# Altium footprint library GyokuRe.PcbLib: 1248 footprints (part 52 of 78)
Each footprint in its own frame and in the unit in brackets; x right, y up, seen from the top. Pads: shape width x height; smd on the part's side, far side on the other; paste and mask are expansions set on the pad; w line width, h text height; cw(c..) or ccw(c..) is an arc to the next point about the centre after c.
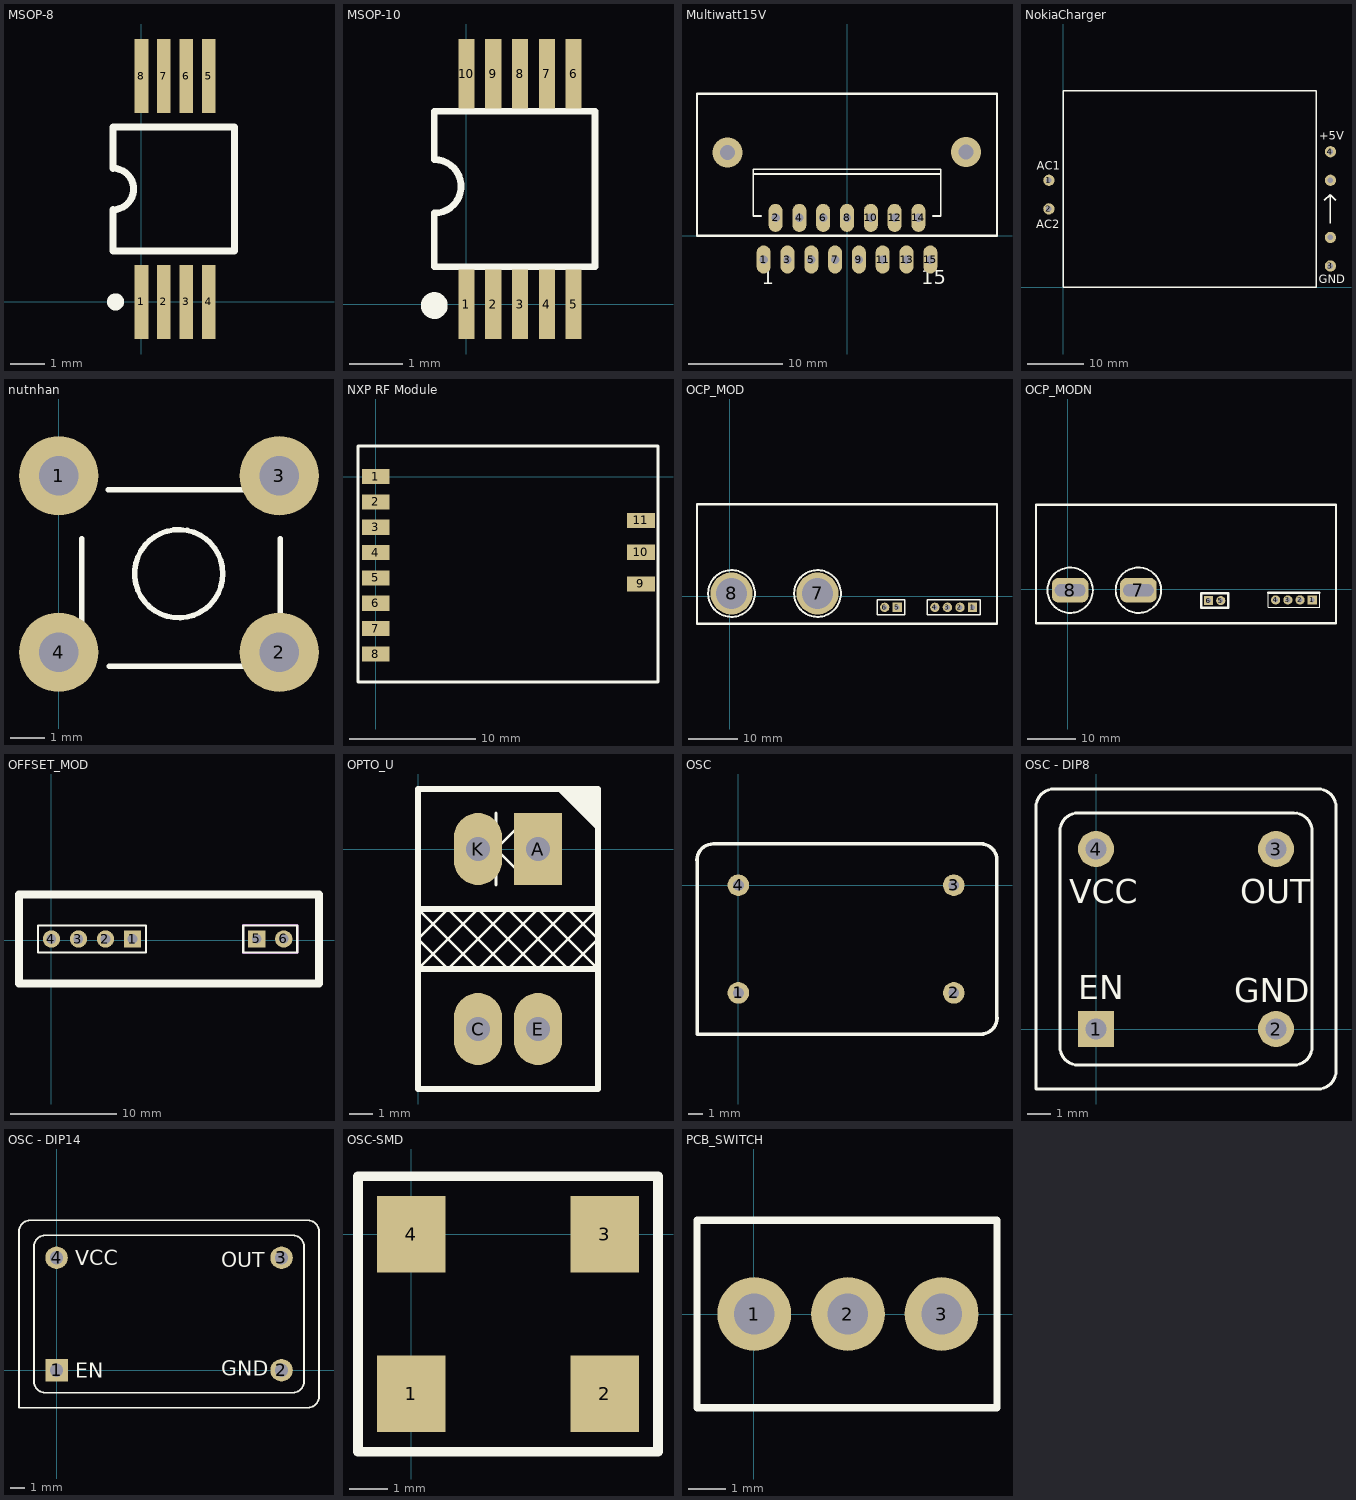
[diagram p51: the footprints below, top view; thin cyan lines are the x and y axes]

## MSOP-8 [mm] "MSOP, Plastic; 8 Leads; Body 3x3 mm; Pitch 0.65 mm"
height 1.99
pads (8):
  rect 0.4x2.15 smd: 1(0,0) 2(0.65,0) 3(1.3,0) 4(1.95,0) 5(1.95,6.55) 6(1.3,6.55) 7(0.65,6.55) 8(0,6.55)
Top Overlay:
  circle w0.25: c-0.75,0 r0.125
  lines w0.2: 2.7,1.475 -0.825,1.475 -0.825,2.675 ccw(c-0.825,3.275) -0.825,3.875 -0.825,5.075 2.7,5.075 2.7,1.5

## MSOP-10 [mm] "MSOP, Plastic; 10 Leads; Body 3x3 mm; Pitch 0.5 mm"
pads (10):
  rect 0.3x1.3 smd: 1(0,0) 2(0.5,0) 3(1,0) 4(1.5,0) 5(2,0) 6(2,4.3) 7(1.5,4.3) 8(1,4.3) 9(0.5,4.3) 10(0,4.3)
Top Overlay:
  circle w0.25: c-0.6,-0.025 r0.125
  lines w0.127: -0.6,0.7 -0.6,1.7 ccw(c-0.6,2.2) -0.6,2.7 -0.6,3.6 2.4,3.6 2.4,0.7 -0.6,0.7

## Multiwatt15V [mm] "TO, Thru-Hole, Vertical, Heatsink Mounted; 15 Bent Staggered Leads; Pitch 1.27 mm"
height 21
pads (15):
  oval 1.5x3 hole 0.9: 1(-8.89,-2.54) 2(-7.62,1.905) 3(-6.35,-2.54) 4(-5.08,1.905) 5(-3.81,-2.54) 6(-2.54,1.905) 7(-1.27,-2.54) 8(0,1.905) 9(1.27,-2.54) 10(2.54,1.905) 11(3.81,-2.54) 12(5.08,1.905) 13(6.35,-2.54) 14(7.62,1.905) 15(8.89,-2.54)
via 12.687,8.928 diameter 3.2 hole 1.6
via -12.763,8.903 diameter 3.2 hole 1.6
Top Overlay:
  lines w0.2: -10,6.59 10,6.59 ; -9.144,2.09 -10,2.09 -10,7.09 10,7.09 10,2.09 9.144,2.09
  lines w0.254: -16,0 16,0 16,15.136 -16,15.136 -16,0
  text "1" at -9.12,-5.165 h1.5
  text "15" at 7.94,-5.165 h1.5
3D body "User Library-MULTIWAT T15.step": height 22.74, standoff -2.18, extent -9.8,-2.815 9.8,6.253

## NokiaCharger [mm]
pads (6):
  round 2 hole 1: 1(-2.54,19.05) 2(-2.54,13.97) 3(47.54,3.81) 4(47.54,24.13) TEMP(47.54,8.89) TEMP(47.54,19.05)
Top Overlay:
  lines w0.254: 46.482,15.494 47.498,16.51 ; 47.498,11.43 47.498,16.51 ; 48.514,15.494 47.498,16.51 ; 0,0 0,35 ; 0,0 45,0 ; 0,0 45,0 ; 0,35 45,35 ; 0,35 45,35 ; 45,0 45,35
  text "GND" at 45.466,0.762 h1.52
  text "+5V" at 45.593,26.289 h1.52
  text "AC1" at -4.699,20.955 h1.52
  text "AC2" at -4.826,10.541 h1.52

## nutnhan [mil]
pads (4):
  round 90 hole 45: 1(0,-100) 2(250,-300) 3(250,-100) 4(0,-300)
Top Overlay:
  circle w6: c136,-211 r50
  lines w6: 26,-266 26,-171 ; 56,-116 211,-116 ; 57,-316 211,-316 ; 251,-266 251,-171
  lines w7: 250,-331 251,-330
3D body "SW3dPS-.STEP": height 275.59, standoff -137.8, extent -25.51,-322.04 285.51,-77.95

## NXP RF Module [mm] "NXP Wireless Module"
pads (11):
  rect 2.2x1.2 smd: 1(0,0) 2(0,-2.007) 3(0,-4.013) 4(0,-6.02) 5(0,-8.026) 6(0,-10.033) 7(0,-12.04) 8(0,-14.046) 9(21,-8.5) 10(21,-5.986) 11(21,-3.472)
Top Overlay:
  lines w0.254: -1.397,-16.256 -1.397,2.413 22.352,2.413 22.352,-16.256 -1.397,-16.256

## OCP_MOD [mil]
pads (8):
  rect 75x75 hole 40: 1(1935,-90) 5(1335,-90)
  round 75 hole 40: 2(1835,-90) 3(1735,-90) 4(1635,-90) 6(1235,-90)
  round 334.65 hole 244.09: 7(700,20) 8(15,20)
Top Overlay:
  circle w16: c15,20 r186
  circle w16: c700,20 r186
  lines w10: 1175,-150 1395,-150 1395,-30 1175,-30 1175,-150 ; 1575,-150 1575,-30 1995,-30 1995,-150 1575,-150
  lines w19.68: -260,730 -260,-220 2130,-220 2130,730 -250,730
3D body "Samtec-TSW-104-07-G-S.step": height 330, standoff -100, extent 1585,-140 1985,-40
3D body "Samtec-TSW-102-07-G-S.step": height 330, standoff -100, extent 1185,-140 1385,-40

## OCP_MODN [mil]
pads (8):
  rect 75x75 hole 40: 1(2005,-90) 6(1155,-95)
  round 75 hole 40: 2(1905,-90) 3(1805,-90) 4(1705,-90) 5(1255,-95)
  rrect50% 300x200 hole 100 slot 250 at 0 deg: 7(580,-10) 8(20,-10)
Top Overlay:
  circle w16: c20,-10 r186
  circle w16: c580,-10 r186
  lines w10: 1095,-35 1095,-155 1315,-155 ; 1645,-30 1645,-150 2065,-150 2065,-30
  lines w19.68: 1095,-40 1095,-155 1315,-155 1315,-35 1095,-35 ; 1645,-30 2065,-30 ; -260,-280 2200,-280 2200,690 -260,690 -260,-280
3D body "Samtec-TSW-104-07-G-S.step": height 330, standoff -100, extent 1655,-140 2055,-40
3D body "Samtec-TSW-102-07-G-S.step": height 330, standoff -100, extent 1105,-145 1305,-45

## OFFSET_MOD [mil]
pads (6):
  rect 64x64 hole 35.43: 1(300,5) 5(759.56,5.28)
  round 64 hole 35.43: 2(200,5) 3(100,5) 4(0,5) 6(859.56,5.28)
Top Overlay:
  lines w7.87: 708.56,54.28 908.56,54.28 ; 709.56,55.28 709.56,-44.72 909.56,-44.72 909.56,55.28 ; -50,-45 -50,55 350,55 350,-45 -50,-45
  lines w30: -120,-160 -120,170 990,170 990,0 990,-160 -120,-160
Bottom Overlay:
  lines w7.87: -50,-45 350,-45 350,55 -50,55 -50,-45 ; 709.56,-44.72 709.56,55.28 909.56,55.28 909.56,-44.72 709.56,-44.72
Mechanical 13:
  lines w7.87: 708.82,-46.18 708.82,56.18 909.61,56.18 909.61,-46.18 708.82,-46.18
3D body: height 100, standoff 10, extent 709,-45 909,55
3D body: height 350, standoff -100, extent 749.56,-4.72 769.56,15.28
3D body: height 350, standoff -100, extent 849.56,-4.72 869.56,15.28
3D body: height 350, standoff -100, extent -10,-5 10,15
3D body: height 350, standoff -100, extent 90,-5 110,15
3D body: height 350, standoff -100, extent 190,-5 210,15
3D body: height 350, standoff -100, extent 290,-5 310,15
3D body: height 100, standoff 10, extent 150,-45 350,55
3D body: height 100, standoff 10, extent 50,-45 250,55
3D body: height 100, standoff 10, extent -50,-45 150,55

## OPTO_U [mil] "Opto hinh chu U"
height 104.33
pads (4):
  rect 80x120 hole 40: A(200,0)
  oval 80x120 hole 40: C(100,-300) E(200,-300) K(100,0)
Top Overlay:
  region: 297.5,97.5 232.5,97.5 297.5,32.5
  lines w5: 0,-200 50,-150 100,-100 200,-200 230,-170 300,-100 300,-200 200,-100 100,-200 90,-190 60,-160 0,-100 ; 130,-60 130,60 ; 180,-50 130,0 180,50 ; 180,-50 180,50 ; 180,-50 180,50 ; 0,-150 50,-100 150,-200 250,-100 300,-150 250,-200 150,-100 50,-200 30,-180 0,-150
  lines w10: 0,-200 300,-200 ; 0,-150 0,-110 ; 0,-100 300,-100 ; 300,-150 300,-140 ; 0,-400 0,100 300,100 300,-400 0,-400
3D body "SW3dPS-optek opb620.STEP": height 374.02, standoff -100, extent 43.46,-346.85 260,46.85

## OSC [mil] "Sealed Oscillator; Through-Hole; 4 Leads"
pads (4):
  round 60 hole 30: 1(0,-300) 2(600,-300) 3(600,0) 4(0,0)
Top Overlay:
  lines w10: -115.21,69.79 cw(c-70,69.79) -70,115 675,115 ; -115,70 -115,-415 675,-415 ccw(c675,-369.79) 720.21,-369.79 ; 674.79,115.21 cw(c674.79,70) 720,70 720,-370
3D body "User Library-ocs-1.step": height 215.03, standoff -225.91, extent -98.62,-398.02 698.63,98.04

## OSC - DIP8 [mil]
pads (4):
  rect 60x60 hole 35.43: 1(0,0)
  round 60 hole 35.43: 2(300,0) 3(300,300) 4(0,300)
Top Overlay:
  lines w5: 359.1,337.28 ccw(c330,330) 330,360 -30,360 ccw(c-30,330) -60,330 -60,-30 ccw(c-30,-30) -30,-60 330,-60 ccw(c330,-30) 360,-30 ; 360,-35 360,335 ; 400,370 ccw(c370,370) 370,400 -70,400 ccw(c-70,370) -100,370 -100,-100 370,-100 ccw(c370,-70) 400,-70 400,375
  text "EN" at -30,50 h40
  text "GND" at 230,45 h40
  text "OUT" at 240,210 h40
  text "VCC" at -45,210 h40

## OSC - DIP14 [mil]
pads (4):
  rect 60x60 hole 35.43: 1(0,0)
  round 60 hole 35.43: 2(600,0) 3(600,300) 4(0,300)
Top Overlay:
  lines w5: -100,-100 670,-100 ccw(c670,-70) 700,-70 700,370 ccw(c670,370) 670,400 -70,400 ccw(c-70,370) -100,370 -100,-100 ; -60,-30 ccw(c-30,-30) -30,-60 630,-60 ccw(c630,-30) 660,-30 660,330 ccw(c630,330) 630,360 -30,360 ccw(c-30,330) -60,330 -60,-30
  text "VCC" at 50,280 h40
  text "OUT" at 440,275 h40
  text "GND" at 440,-15 h40
  text "EN" at 50,-20 h40

## OSC-SMD [mm] "Sealed Oscillator; SMD; 4 Leads"
pads (4):
  rect 1.8x2 smd: 1(0,-4.191) 2(5.08,-4.191) 3(5.08,0) 4(0,0)
Top Overlay:
  lines w0.254: -1.397,-5.715 -1.397,1.524 6.477,1.524 6.477,-5.715 -1.397,-5.715
3D body "User Library-GeyerElectronics_KX13.step": height -0.43, standoff -1.74, extent -0.96,-4.587 6.04,0.414

## PCB_SWITCH [mm]
pads (3):
  round 2 hole 1.1: 1(0.011,0.005) 2(2.551,0.005) 3(5.091,0.005)
Top Overlay:
  lines w0.2: -1.539,-2.535 -1.539,2.545 6.591,2.545 6.591,-2.535 -1.539,-2.535
3D body: height 8, standoff 0, extent 0.269,-2.271 4.811,2.271
3D body: height 15, standoff 0, extent 1.822,-0.718 3.258,0.718
3D body: height 5.08, standoff 0, extent -1.524,-2.54 6.604,2.54

## PCBComponent_1 [mm]